# Altium integrated library Dip_Switches_rev15a.intlib: 131 symbols (part 2 of 2)
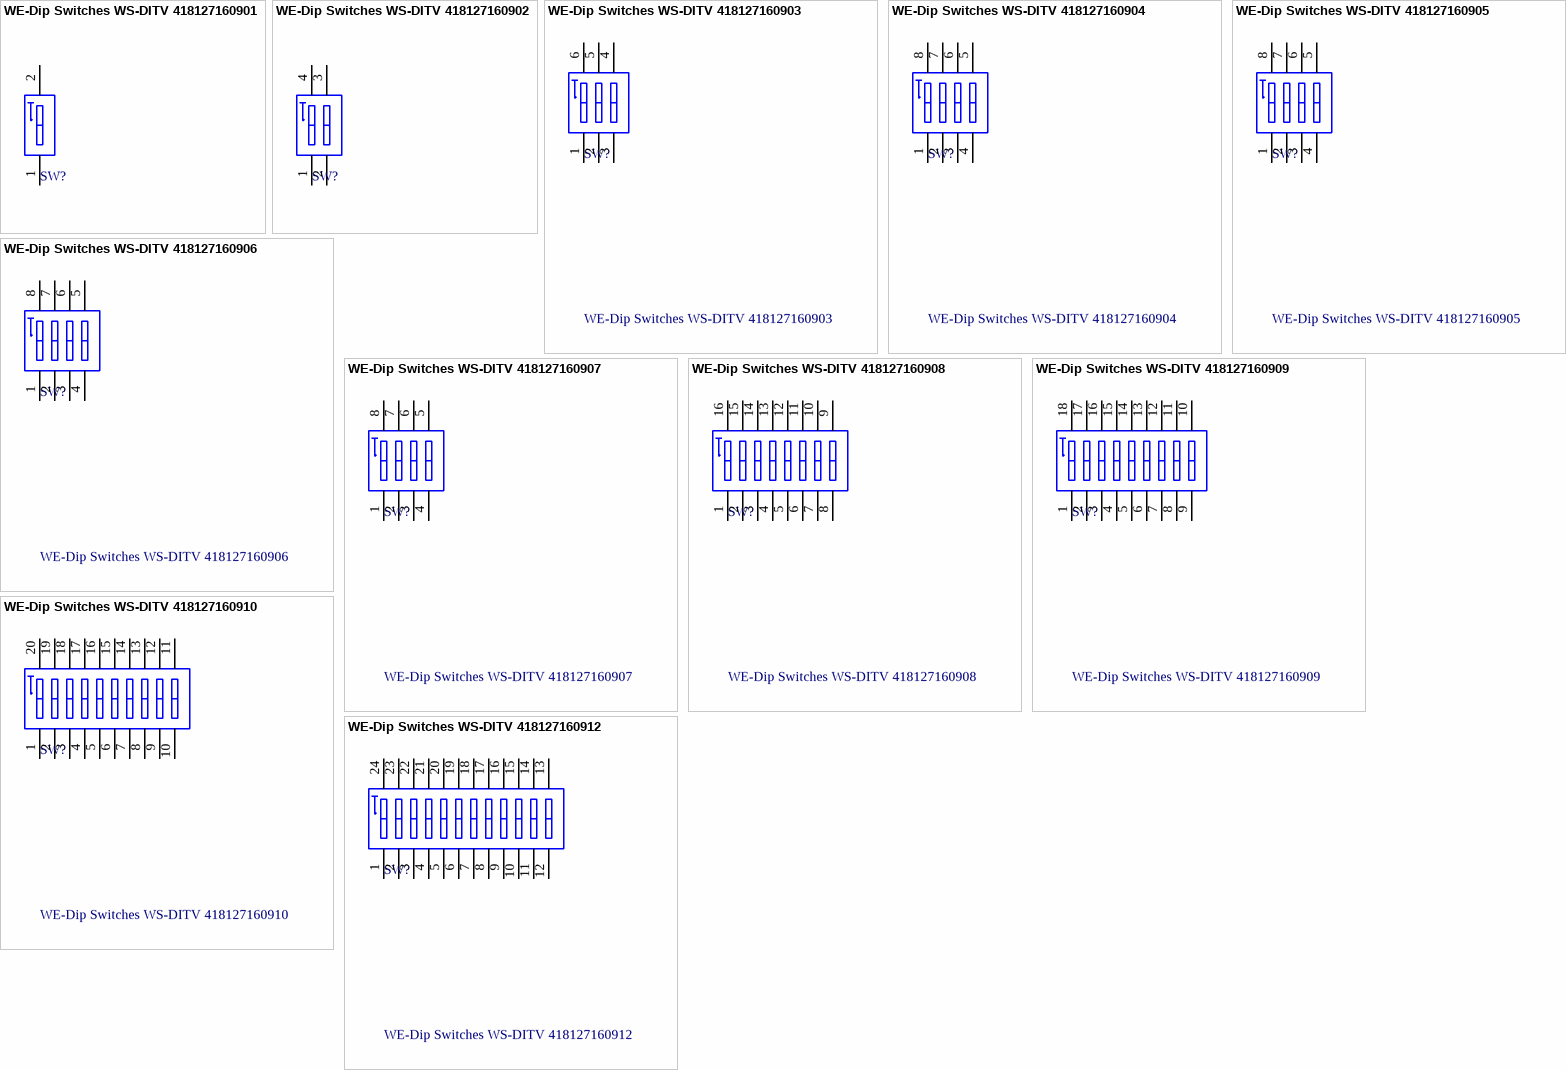
[diagram p13: symbols WE-Dip Switches WS-DITV 418127160901 to WE-Dip Switches WS-DITV 418127160912]

## WE-Dip Switches WS-DITV 418127160901
designator SW?
WS-DITV 2.54 mm small compact THT Dip Switch with top tape; Manufacturer: Würth Elektronik eiSos GmbH & Co.KG; ComponentLink1 Description: Manufacturer; ComponentLink2 Description: Datasheet; Creat by: Karrer Zheng; NoPins: 2; Creat Date: 20 February 2014; partNo: 418127160901; ComponentLink1URL: http://www.we-online.com; ComponentLink2URL: http://katalog.we-online.de/em/datasheet/4181271609xx.pdf
footprint 418127160901 (01p, 2.54mm Pitch, Horizontal, IC Type, THT, flat Actuator, black, with Tape, Tube)
pins: 1, 2

## WE-Dip Switches WS-DITV 418127160902
designator SW?
WS-DITV 2.54 mm small compact THT Dip Switch with top tape; Manufacturer: Würth Elektronik eiSos GmbH & Co.KG; ComponentLink1 Description: Manufacturer; ComponentLink2 Description: Datasheet; Creat by: Karrer Zheng; NoPins: 4; Creat Date: 20 February 2014; partNo: 418127160902; ComponentLink1URL: http://www.we-online.com; ComponentLink2URL: http://katalog.we-online.de/em/datasheet/4181271609xx.pdf
footprint 418127160902 (02p, 2.54mm Pitch, Horizontal, IC Type, THT, flat Actuator, black, with Tape, Tube)
pins: 1, 2, 3, 4

## WE-Dip Switches WS-DITV 418127160903
designator SW?
WS-DITV 2.54 mm small compact THT Dip Switch with top tape; Manufacturer: Würth Elektronik eiSos GmbH & Co.KG; ComponentLink1 Description: Manufacturer; ComponentLink2 Description: Datasheet; Creat by: Karrer Zheng; NoPins: 6; Creat Date: 20 February 2014; partNo: 418127160903; ComponentLink1URL: http://www.we-online.com; ComponentLink2URL: http://katalog.we-online.de/em/datasheet/4181271609xx.pdf
footprint 418127160903 (03p, 2.54mm Pitch, Horizontal, IC Type, THT, flat Actuator, black, with Tape, Tube)
pins: 1, 2, 3, 4, 5, 6

## WE-Dip Switches WS-DITV 418127160904
designator SW?
WS-DITV 2.54 mm small compact THT Dip Switch with top tape; Manufacturer: Würth Elektronik eiSos GmbH & Co.KG; ComponentLink1 Description: Manufacturer; ComponentLink2 Description: Datasheet; Creat by: Karrer Zheng; NoPins: 8; Creat Date: 20 February 2014; partNo: 418127160904; ComponentLink1URL: http://www.we-online.com; ComponentLink2URL: http://katalog.we-online.de/em/datasheet/4181271609xx.pdf
footprint 418127160904 (04p, 2.54mm Pitch, Horizontal, IC Type, THT, flat Actuator, black, with Tape, Tube)
pins: 1, 2, 3, 4, 5, 6, 7, 8

## WE-Dip Switches WS-DITV 418127160905
designator SW?
WS-DITV 2.54 mm small compact THT Dip Switch with top tape; Manufacturer: Würth Elektronik eiSos GmbH & Co.KG; ComponentLink1 Description: Manufacturer; ComponentLink2 Description: Datasheet; Creat by: Karrer Zheng; NoPins: 10; Creat Date: 20 February 2014; partNo: 418127160905; ComponentLink1URL: http://www.we-online.com; ComponentLink2URL: http://katalog.we-online.de/em/datasheet/4181271609xx.pdf
footprint 418127160905 (05p, 2.54mm Pitch, Horizontal, IC Type, THT, flat Actuator, black, with Tape, Tube)
pins: 1, 2, 3, 4, 5, 6, 7, 8

## WE-Dip Switches WS-DITV 418127160906
designator SW?
WS-DITV 2.54 mm small compact THT Dip Switch with top tape; Manufacturer: Würth Elektronik eiSos GmbH & Co.KG; ComponentLink1 Description: Manufacturer; ComponentLink2 Description: Datasheet; Creat by: Karrer Zheng; NoPins: 12; Creat Date: 20 February 2014; partNo: 418127160906; ComponentLink1URL: http://www.we-online.com; ComponentLink2URL: http://katalog.we-online.de/em/datasheet/4181271609xx.pdf
footprint 418127160906 (06p, 2.54mm Pitch, Horizontal, IC Type, THT, flat Actuator, black, with Tape, Tube)
pins: 1, 2, 3, 4, 5, 6, 7, 8

## WE-Dip Switches WS-DITV 418127160907
designator SW?
WS-DITV 2.54 mm small compact THT Dip Switch with top tape; Manufacturer: Würth Elektronik eiSos GmbH & Co.KG; ComponentLink1 Description: Manufacturer; ComponentLink2 Description: Datasheet; Creat by: Karrer Zheng; NoPins: 14; Creat Date: 20 February 2014; partNo: 418127160907; ComponentLink1URL: http://www.we-online.com; ComponentLink2URL: http://katalog.we-online.de/em/datasheet/4181271609xx.pdf
footprint 418127160907 (07p, 2.54mm Pitch, Horizontal, IC Type, THT, flat Actuator, black, with Tape, Tube)
pins: 1, 2, 3, 4, 5, 6, 7, 8

## WE-Dip Switches WS-DITV 418127160908
designator SW?
WS-DITV 2.54 mm small compact THT Dip Switch with top tape; Manufacturer: Würth Elektronik eiSos GmbH & Co.KG; ComponentLink1 Description: Manufacturer; ComponentLink2 Description: Datasheet; Creat by: Karrer Zheng; NoPins: 16; Creat Date: 20 February 2014; partNo: 418127160908; ComponentLink1URL: http://www.we-online.com; ComponentLink2URL: http://katalog.we-online.de/em/datasheet/4181271609xx.pdf
footprint 418127160908 (08p, 2.54mm Pitch, Horizontal, IC Type, THT, flat Actuator, black, with Tape, Tube)
pins: 1, 2, 3, 4, 5, 6, 7, 8, 9, 10, 11, 12, 13, 14, 15, 16

## WE-Dip Switches WS-DITV 418127160909
designator SW?
WS-DITV 2.54 mm small compact THT Dip Switch with top tape; Manufacturer: Würth Elektronik eiSos GmbH & Co.KG; ComponentLink1 Description: Manufacturer; ComponentLink2 Description: Datasheet; Creat by: Karrer Zheng; NoPins: 18; Creat Date: 20 February 2014; partNo: 418127160909; ComponentLink1URL: http://www.we-online.com; ComponentLink2URL: http://katalog.we-online.de/em/datasheet/4181271609xx.pdf
footprint 418127160909 (09p, 2.54mm Pitch, Horizontal, IC Type, THT, flat Actuator, black, with Tape, Tube)
pins: 1, 2, 3, 4, 5, 6, 7, 8, 9, 10, 11, 12, 13, 14, 15, 16, 17, 18

## WE-Dip Switches WS-DITV 418127160910
designator SW?
WS-DITV 2.54 mm small compact THT Dip Switch with top tape; Manufacturer: Würth Elektronik eiSos GmbH & Co.KG; ComponentLink1 Description: Manufacturer; ComponentLink2 Description: Datasheet; Creat by: Karrer Zheng; NoPins: 20; Creat Date: 20 February 2014; partNo: 418127160910; ComponentLink1URL: http://www.we-online.com; ComponentLink2URL: http://katalog.we-online.de/em/datasheet/4181271609xx.pdf
footprint 418127160910 (10p, 2.54mm Pitch, Horizontal, IC Type, THT, flat Actuator, black, with Tape, Tube)
pins: 1, 2, 3, 4, 5, 6, 7, 8, 9, 10, 11, 12, 13, 14, 15, 16, 17, 18, 19, 20

## WE-Dip Switches WS-DITV 418127160912
designator SW?
WS-DITV 2.54 mm small compact THT Dip Switch with top tape; Manufacturer: Würth Elektronik eiSos GmbH & Co.KG; ComponentLink1 Description: Manufacturer; ComponentLink2 Description: Datasheet; Creat by: Karrer Zheng; NoPins: 24; Creat Date: 20 February 2014; partNo: 418127160912; ComponentLink1URL: http://www.we-online.com; ComponentLink2URL: http://katalog.we-online.de/em/datasheet/4181271609xx.pdf
footprint 418127160912 (12p, 2.54mm Pitch, Horizontal, IC Type, THT, flat Actuator, black, with Tape, Tube)
pins: 1, 2, 3, 4, 5, 6, 7, 8, 9, 10, 11, 12, 13, 14, 15, 16, 17, 18, 19, 20, 21, 22, 23, 24


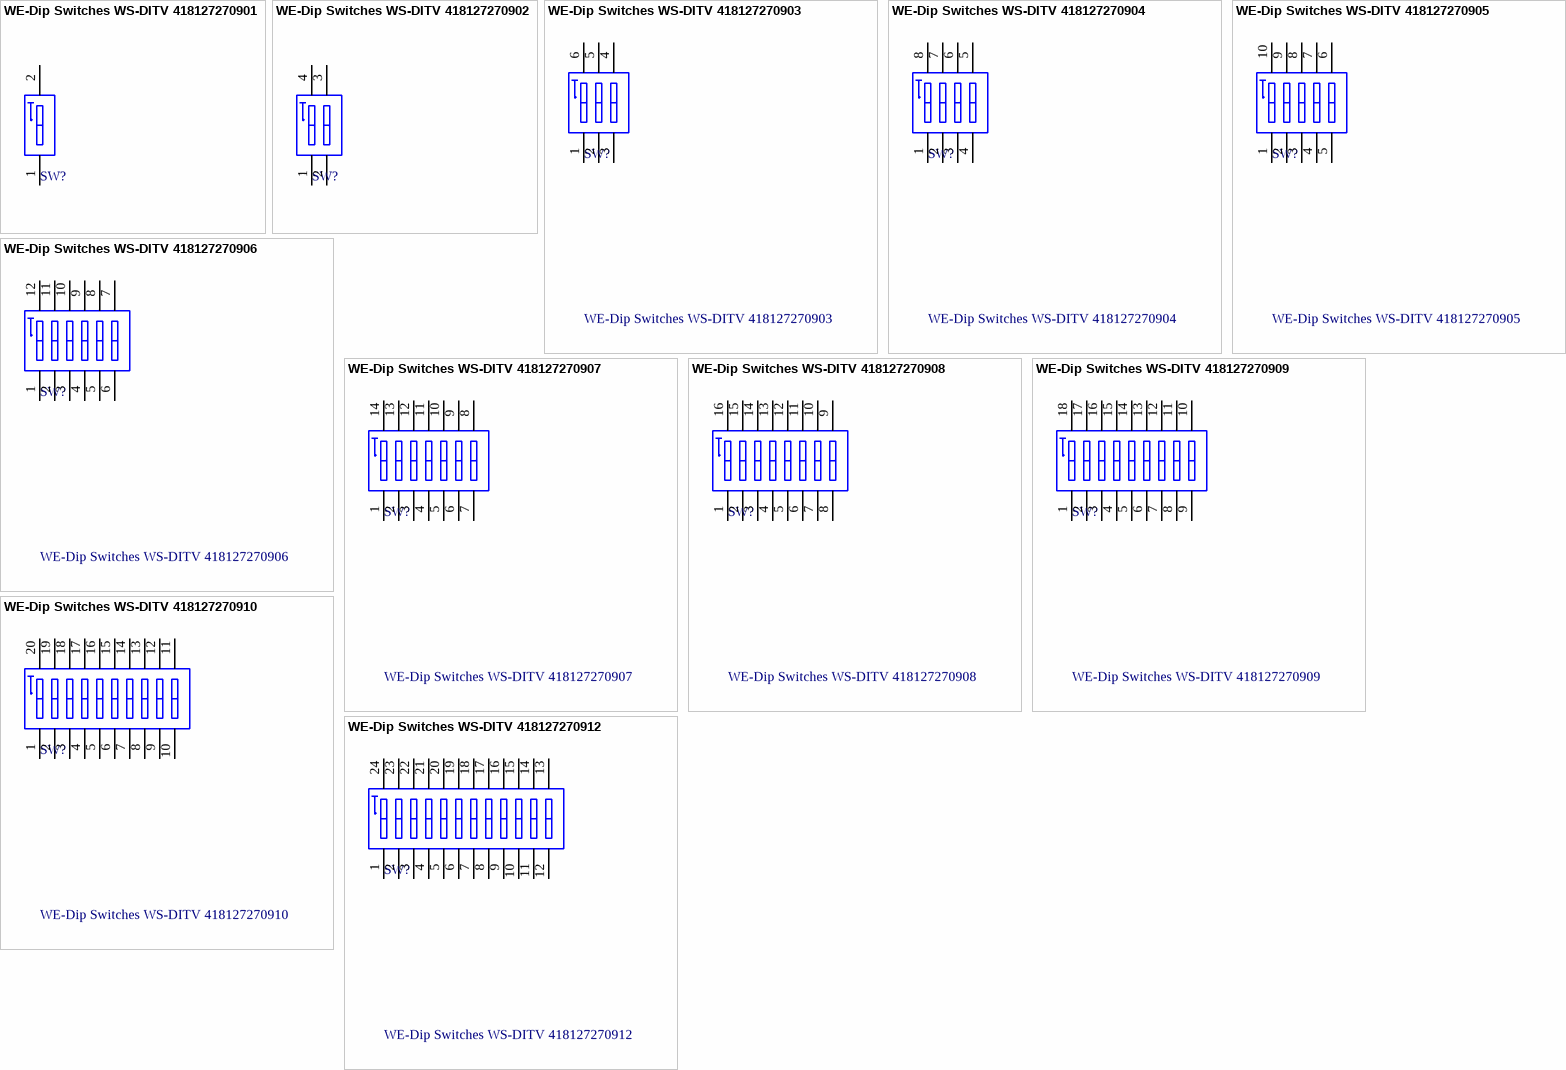
[diagram p12: symbols WE-Dip Switches WS-DITV 418127270901 to WE-Dip Switches WS-DITV 418127270912]

## WE-Dip Switches WS-DITV 418127270901
designator SW?
WS-DITV 2.54 mm small compact THT Dip Switch with raised actuator; Manufacturer: Würth Elektronik eiSos GmbH & Co.KG; ComponentLink1 Description: Manufacturer; ComponentLink2 Description: Datasheet; Creat by: Karrer Zheng; NoPins: 2; Creat Date: 20 February 2014; partNo: 418127270901; ComponentLink1URL: http://www.we-online.com; ComponentLink2URL: http://katalog.we-online.de/em/datasheet/4181272709xx.pdf
footprint 418127270901 (01p, 2.54mm Pitch, Horizontal, IC Type, THT, raised Actuator, black, without Tape, Tube)
pins: 1, 2

## WE-Dip Switches WS-DITV 418127270902
designator SW?
WS-DITV 2.54 mm small compact THT Dip Switch with raised actuator; Manufacturer: Würth Elektronik eiSos GmbH & Co.KG; ComponentLink1 Description: Manufacturer; ComponentLink2 Description: Datasheet; Creat by: Karrer Zheng; NoPins: 4; Creat Date: 20 February 2014; partNo: 418127270902; ComponentLink1URL: http://www.we-online.com; ComponentLink2URL: http://katalog.we-online.de/em/datasheet/4181272709xx.pdf
footprint 418127270902 (02p, 2.54mm Pitch, Horizontal, IC Type, THT, raised Actuator, black, without Tape, Tube)
pins: 1, 2, 3, 4

## WE-Dip Switches WS-DITV 418127270903
designator SW?
WS-DITV 2.54 mm small compact THT Dip Switch with raised actuator; Manufacturer: Würth Elektronik eiSos GmbH & Co.KG; ComponentLink1 Description: Manufacturer; ComponentLink2 Description: Datasheet; Creat by: Karrer Zheng; NoPins: 6; Creat Date: 20 February 2014; partNo: 418127270903; ComponentLink1URL: http://www.we-online.com; ComponentLink2URL: http://katalog.we-online.de/em/datasheet/4181272709xx.pdf
footprint 418127270903 (03p, 2.54mm Pitch, Horizontal, IC Type, THT, raised Actuator, black, without Tape, Tube)
pins: 1, 2, 3, 4, 5, 6

## WE-Dip Switches WS-DITV 418127270904
designator SW?
WS-DITV 2.54 mm small compact THT Dip Switch with raised actuator; Manufacturer: Würth Elektronik eiSos GmbH & Co.KG; ComponentLink1 Description: Manufacturer; ComponentLink2 Description: Datasheet; Creat by: Karrer Zheng; NoPins: 8; Creat Date: 20 February 2014; partNo: 418127270904; ComponentLink1URL: http://www.we-online.com; ComponentLink2URL: http://katalog.we-online.de/em/datasheet/4181272709xx.pdf
footprint 418127270904 (04p, 2.54mm Pitch, Horizontal, IC Type, THT, raised Actuator, black, without Tape, Tube)
pins: 1, 2, 3, 4, 5, 6, 7, 8

## WE-Dip Switches WS-DITV 418127270905
designator SW?
WS-DITV 2.54 mm small compact THT Dip Switch with raised actuator; Manufacturer: Würth Elektronik eiSos GmbH & Co.KG; ComponentLink1 Description: Manufacturer; ComponentLink2 Description: Datasheet; Creat by: Karrer Zheng; NoPins: 10; Creat Date: 20 February 2014; partNo: 418127270905; ComponentLink1URL: http://www.we-online.com; ComponentLink2URL: http://katalog.we-online.de/em/datasheet/4181272709xx.pdf
footprint 418127270905 (05p, 2.54mm Pitch, Horizontal, IC Type, THT, raised Actuator, black, without Tape, Tube)
pins: 1, 2, 3, 4, 5, 6, 7, 8, 9, 10

## WE-Dip Switches WS-DITV 418127270906
designator SW?
WS-DITV 2.54 mm small compact THT Dip Switch with raised actuator; Manufacturer: Würth Elektronik eiSos GmbH & Co.KG; ComponentLink1 Description: Manufacturer; ComponentLink2 Description: Datasheet; Creat by: Karrer Zheng; NoPins: 12; Creat Date: 20 February 2014; partNo: 418127270906; ComponentLink1URL: http://www.we-online.com; ComponentLink2URL: http://katalog.we-online.de/em/datasheet/4181272709xx.pdf
footprint 418127270906 (06p, 2.54mm Pitch, Horizontal, IC Type, THT, raised Actuator, black, without Tape, Tube)
pins: 1, 2, 3, 4, 5, 6, 7, 8, 9, 10, 11, 12

## WE-Dip Switches WS-DITV 418127270907
designator SW?
WS-DITV 2.54 mm small compact THT Dip Switch with raised actuator; Manufacturer: Würth Elektronik eiSos GmbH & Co.KG; ComponentLink1 Description: Manufacturer; ComponentLink2 Description: Datasheet; Creat by: Karrer Zheng; NoPins: 14; Creat Date: 20 February 2014; partNo: 418127270907; ComponentLink1URL: http://www.we-online.com; ComponentLink2URL: http://katalog.we-online.de/em/datasheet/4181272709xx.pdf
footprint 418127270907 (07p, 2.54mm Pitch, Horizontal, IC Type, THT, raised Actuator, black, without Tape, Tube)
pins: 1, 2, 3, 4, 5, 6, 7, 8, 9, 10, 11, 12, 13, 14

## WE-Dip Switches WS-DITV 418127270908
designator SW?
WS-DITV 2.54 mm small compact THT Dip Switch with raised actuator; Manufacturer: Würth Elektronik eiSos GmbH & Co.KG; ComponentLink1 Description: Manufacturer; ComponentLink2 Description: Datasheet; Creat by: Karrer Zheng; NoPins: 16; Creat Date: 20 February 2014; partNo: 418127270908; ComponentLink1URL: http://www.we-online.com; ComponentLink2URL: http://katalog.we-online.de/em/datasheet/4181272709xx.pdf
footprint 418127270908 (08p, 2.54mm Pitch, Horizontal, IC Type, THT, raised Actuator, black, without Tape, Tube)
pins: 1, 2, 3, 4, 5, 6, 7, 8, 9, 10, 11, 12, 13, 14, 15, 16

## WE-Dip Switches WS-DITV 418127270909
designator SW?
WS-DITV 2.54 mm small compact THT Dip Switch with raised actuator; Manufacturer: Würth Elektronik eiSos GmbH & Co.KG; ComponentLink1 Description: Manufacturer; ComponentLink2 Description: Datasheet; Creat by: Karrer Zheng; NoPins: 18; Creat Date: 20 February 2014; partNo: 418127270909; ComponentLink1URL: http://www.we-online.com; ComponentLink2URL: http://katalog.we-online.de/em/datasheet/4181272709xx.pdf
footprint 418127270909 (09p, 2.54mm Pitch, Horizontal, IC Type, THT, raised Actuator, black, without Tape, Tube)
pins: 1, 2, 3, 4, 5, 6, 7, 8, 9, 10, 11, 12, 13, 14, 15, 16, 17, 18

## WE-Dip Switches WS-DITV 418127270910
designator SW?
WS-DITV 2.54 mm small compact THT Dip Switch with raised actuator; Manufacturer: Würth Elektronik eiSos GmbH & Co.KG; ComponentLink1 Description: Manufacturer; ComponentLink2 Description: Datasheet; Creat by: Karrer Zheng; NoPins: 20; Creat Date: 20 February 2014; partNo: 418127270910; ComponentLink1URL: http://www.we-online.com; ComponentLink2URL: http://katalog.we-online.de/em/datasheet/4181272709xx.pdf
footprint 418127270910 (10p, 2.54mm Pitch, Horizontal, IC Type, THT, raised Actuator, black, without Tape, Tube)
pins: 1, 2, 3, 4, 5, 6, 7, 8, 9, 10, 11, 12, 13, 14, 15, 16, 17, 18, 19, 20

## WE-Dip Switches WS-DITV 418127270912
designator SW?
WS-DITV 2.54 mm small compact THT Dip Switch with raised actuator; Manufacturer: Würth Elektronik eiSos GmbH & Co.KG; ComponentLink1 Description: Manufacturer; ComponentLink2 Description: Datasheet; Creat by: Karrer Zheng; NoPins: 24; Creat Date: 20 February 2014; partNo: 418127270912; ComponentLink1URL: http://www.we-online.com; ComponentLink2URL: http://katalog.we-online.de/em/datasheet/4181272709xx.pdf
footprint 418127270912 (12p, 2.54mm Pitch, Horizontal, IC Type, THT, raised Actuator, black, without Tape, Tube)
pins: 1, 2, 3, 4, 5, 6, 7, 8, 9, 10, 11, 12, 13, 14, 15, 16, 17, 18, 19, 20, 21, 22, 23, 24